# Altium footprint library NDLib.PCBLIB: 499 footprints (part 17 of 32)
Each footprint in its own frame and in the unit in brackets; x right, y up, seen from the top. Pads: shape width x height; smd on the part's side, far side on the other; paste and mask are expansions set on the pad; w line width, h text height; cw(c..) or ccw(c..) is an arc to the next point about the centre after c.
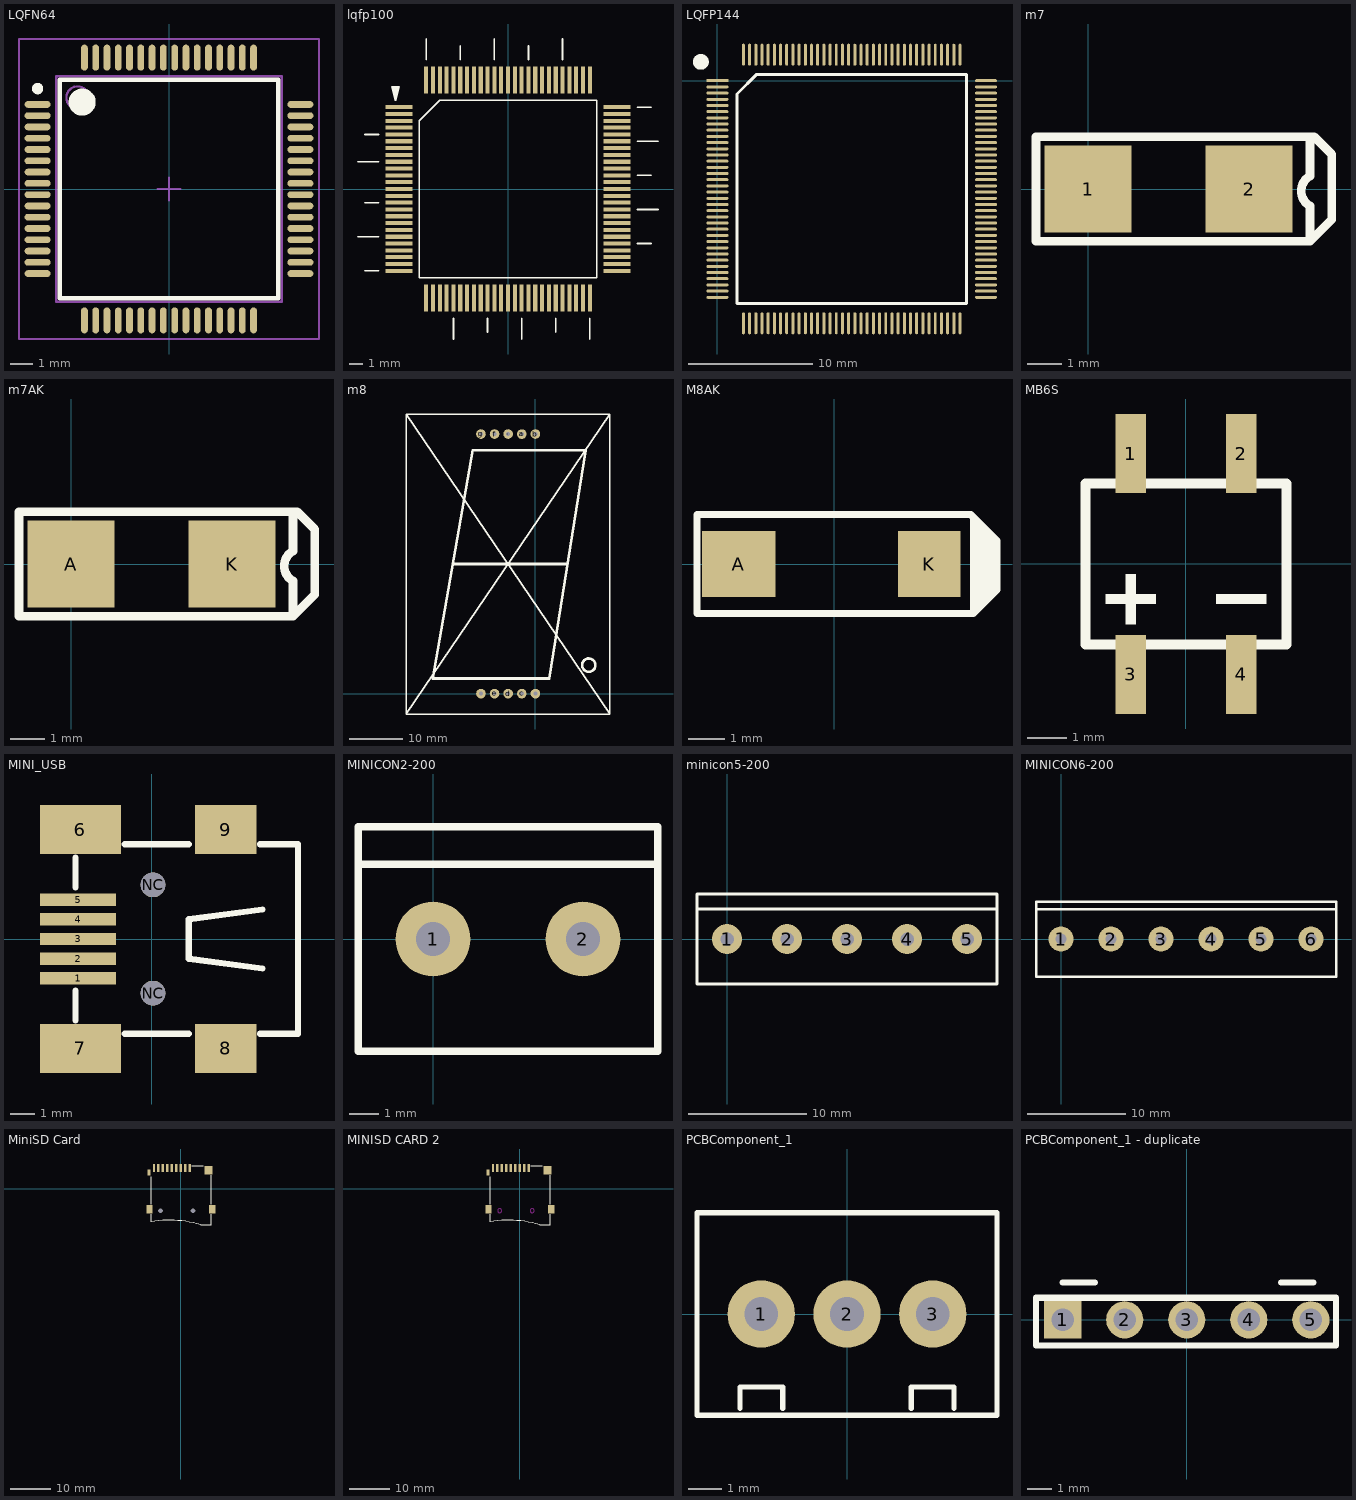
[diagram p16: the footprints below, top view; thin cyan lines are the x and y axes]

## LQFN64 [mm] "TSQFP, 64-Leads, Body 12.0x12.0mm (max), Pitch 0.50mm, IPC Medium Density"
height 1.5
pads (64):
  oval 1.15x0.3 smd: 1(-5.825,3.75) 2(-5.825,3.25) 3(-5.825,2.75) 4(-5.825,2.25) 5(-5.825,1.75) 6(-5.825,1.25) 7(-5.825,0.75) 8(-5.825,0.25) 9(-5.825,-0.25) 10(-5.825,-0.75) 11(-5.825,-1.25) 12(-5.825,-1.75) 13(-5.825,-2.25) 14(-5.825,-2.75) 15(-5.825,-3.25) 16(-5.825,-3.75) 33(5.825,-3.75) 34(5.825,-3.25) 35(5.825,-2.75) 36(5.825,-2.25) 37(5.825,-1.75) 38(5.825,-1.25) 39(5.825,-0.75) 40(5.825,-0.25) 41(5.825,0.25) 42(5.825,0.75) 43(5.825,1.25) 44(5.825,1.75) 45(5.825,2.25) 46(5.825,2.75) 47(5.825,3.25) 48(5.825,3.75)
  oval 0.3x1.15 smd: 17(-3.75,-5.825) 18(-3.25,-5.825) 19(-2.75,-5.825) 20(-2.25,-5.825) 21(-1.75,-5.825) 22(-1.25,-5.825) 23(-0.75,-5.825) 24(-0.25,-5.825) 25(0.25,-5.825) 26(0.75,-5.825) 27(1.25,-5.825) 28(1.75,-5.825) 29(2.25,-5.825) 30(2.75,-5.825) 31(3.25,-5.825) 32(3.75,-5.825) 49(3.75,5.825) 50(3.25,5.825) 51(2.75,5.825) 52(2.25,5.825) 53(1.75,5.825) 54(1.25,5.825) 55(0.75,5.825) 56(0.25,5.825) 57(-0.25,5.825) 58(-0.75,5.825) 59(-1.25,5.825) 60(-1.75,5.825) 61(-2.25,5.825) 62(-2.75,5.825) 63(-3.25,5.825) 64(-3.75,5.825)
TopOverlay:
  circle w0.25: c-5.825,4.45 r0.125
  circle w0.6: c-3.85,3.85 r0.3
  lines w0.2: -4.85,-4.85 -4.85,4.85 4.85,4.85 4.85,-4.85 -4.85,-4.85
Mechanical13:
  circle w0.1: c-4.05,4.05 r0.5
  lines w0.1: -5,-5 -5,5 5,5 5,-5 -5,-5
Mechanical15:
  lines w0.1: -0.5,0 0.5,0 ; 0,-0.5 0,0.5 ; -6.65,-6.65 -6.65,6.65 6.65,6.65 6.65,-6.65 -6.65,-6.65
3D body: height 1.5, standoff 0.1, extent -5,-5 5,5

## lqfp100 [mm]
pads (100):
  rect 2x0.3 smd: 1(-8,6) 2(-8,5.5) 3(-8,5) 4(-8,4.5) 5(-8,4) 6(-8,3.5) 7(-8,3) 8(-8,2.5) 9(-8,2) 10(-8,1.5) 11(-8,1) 12(-8,0.5) 13(-8,0) 14(-8,-0.5) 15(-8,-1) 16(-8,-1.5) 17(-8,-2) 18(-8,-2.5) 19(-8,-3) 20(-8,-3.5) 21(-8,-4) 22(-8,-4.5) 23(-8,-5) 24(-8,-5.5) 25(-8,-6) 51(8,-6) 52(8,-5.5) 53(8,-5) 54(8,-4.5) 55(8,-4) 56(8,-3.5) 57(8,-3) 58(8,-2.5) 59(8,-2) 60(8,-1.5) 61(8,-1) 62(8,-0.5) 63(8,0) 64(8,0.5) 65(8,1) 66(8,1.5) 67(8,2) 68(8,2.5) 69(8,3) 70(8,3.5) 71(8,4) 72(8,4.5) 73(8,5) 74(8,5.5) 75(8,6)
  rect 0.3x2 smd: 26(-6,-8) 27(-5.5,-8) 28(-5,-8) 29(-4.5,-8) 30(-4,-8) 31(-3.5,-8) 32(-3,-8) 33(-2.5,-8) 34(-2,-8) 35(-1.5,-8) 36(-1,-8) 37(-0.5,-8) 38(0,-8) 39(0.5,-8) 40(1,-8) 41(1.5,-8) 42(2,-8) 43(2.5,-8) 44(3,-8) 45(3.5,-8) 46(4,-8) 47(4.5,-8) 48(5,-8) 49(5.5,-8) 50(6,-8) 76(6,8) 77(5.5,8) 78(5,8) 79(4.5,8) 80(4,8) 81(3.5,8) 82(3,8) 83(2.5,8) 84(2,8) 85(1.5,8) 86(1,8) 87(0.5,8) 88(0,8) 89(-0.5,8) 90(-1,8) 91(-1.5,8) 92(-2,8) 93(-2.5,8) 94(-3,8) 95(-3.5,8) 96(-4,8) 97(-4.5,8) 98(-5,8) 99(-5.5,8) 100(-6,8)
TopOverlay:
  region: -8.5,7.5 -8.25,6.5 -8,7.5
  lines w0.127: -11,-3.5 -9.5,-3.5 ; -11,2 -9.5,2 ; -10.5,-6 -9.5,-6 ; -10.5,-1 -9.5,-1 ; -10.5,4 -9.5,4 ; -6,9.5 -6,11 ; -4,-11 -4,-9.5 ; -3.5,9.5 -3.5,10.5 ; -1.5,-10.5 -1.5,-9.5 ; -1,9.5 -1,11 ; 1,-11 1,-9.5 ; 1.5,9.5 1.5,10.5 ; 3.5,-10.5 3.5,-9.5 ; 4,9.5 4,11 ; 6,-11 6,-9.5 ; 9.5,-4 10.5,-4 ; 9.5,-1.5 11,-1.5 ; 9.5,1 10.5,1 ; 9.5,3.5 11,3.5 ; 9.5,6 10.5,6 ; -8.5,7.5 -8,7.5 -8.25,6.5 -8.5,7.5 ; -6.5,-6.5 6.5,-6.5 6.5,6.5 -5,6.5 -6.5,5 -6.5,-6.5
3D body: height 1.61, standoff -0.01, extent -8.001,-7.999 7.999,8.001

## LQFP144 [mil]
height 100
pads (144):
  rect 70x9.5 smd: 1(0,0)
  oval 70x9.5 smd: 2(0,-19.68) 3(0,-39.37) 4(0,-59.05) 5(0,-78.74) 6(0,-98.42) 7(0,-118.11) 8(0,-137.79) 9(0,-157.48) 10(0,-177.16) 11(0,-196.85) 12(0,-216.53) 13(0,-236.22) 14(0,-255.91) 15(0,-275.59) 16(0,-295.27) 17(0,-314.96) 18(0,-334.64) 19(0,-354.33) 20(0,-374.01) 21(0,-393.7) 22(0,-413.38) 23(0,-433.07) 24(0,-452.75) 25(0,-472.44) 26(0,-492.12) 27(0,-511.81) 28(0,-531.5) 29(0,-551.18) 30(0,-570.87) 31(0,-590.55) 32(0,-610.24) 33(0,-629.92) 34(0,-649.61) 35(0,-669.29) 36(0,-688.98) 73(854.33,-688.98) 74(854.33,-669.29) 75(854.33,-649.61) 76(854.33,-629.92) 77(854.33,-610.24) 78(854.33,-590.55) 79(854.33,-570.87) 80(854.33,-551.18) 81(854.33,-531.5) 82(854.33,-511.81) 83(854.33,-492.12) 84(854.33,-472.44) 85(854.33,-452.75) 86(854.33,-433.07) 87(854.33,-413.38) 88(854.33,-393.7) 89(854.33,-374.01) 90(854.33,-354.33) 91(854.33,-334.64) 92(854.33,-314.96) 93(854.33,-295.27) 94(854.33,-275.59) 95(854.33,-255.91) 96(854.33,-236.22) 97(854.33,-216.53) 98(854.33,-196.85) 99(854.33,-177.16) 100(854.33,-157.48) 101(854.33,-137.79) 102(854.33,-118.11) 103(854.33,-98.42) 104(854.33,-78.74) 105(854.33,-59.05) 106(854.33,-39.37) 107(854.33,-19.68) 108(854.33,0)
  oval 9.5x70 smd: 37(82.68,-771.65) 38(102.36,-771.65) 39(122.05,-771.65) 40(141.73,-771.65) 41(161.42,-771.65) 42(181.1,-771.65) 43(200.79,-771.65) 44(220.47,-771.65) 45(240.16,-771.65) 46(259.84,-771.65) 47(279.53,-771.65) 48(299.21,-771.65) 49(318.9,-771.65) 50(338.58,-771.65) 51(358.27,-771.65) 52(377.95,-771.65) 53(397.64,-771.65) 54(417.32,-771.65) 55(437.01,-771.65) 56(456.69,-771.65) 57(476.38,-771.65) 58(496.06,-771.65) 59(515.75,-771.65) 60(535.43,-771.65) 61(555.12,-771.65) 62(574.8,-771.65) 63(594.49,-771.65) 64(614.17,-771.65) 65(633.86,-771.65) 66(653.54,-771.65) 67(673.23,-771.65) 68(692.91,-771.65) 69(712.6,-771.65) 70(732.28,-771.65) 71(751.97,-771.65) 72(771.65,-771.65) 109(771.65,82.68) 110(751.97,82.68) 111(732.28,82.68) 112(712.6,82.68) 113(692.91,82.68) 114(673.23,82.68) 115(653.54,82.68) 116(633.86,82.68) 117(614.17,82.68) 118(594.49,82.68) 119(574.8,82.68) 120(555.12,82.68) 121(535.43,82.68) 122(515.75,82.68) 123(496.06,82.68) 124(476.38,82.68) 125(456.69,82.68) 126(437.01,82.68) 127(417.32,82.68) 128(397.64,82.68) 129(377.95,82.68) 130(358.27,82.68) 131(338.58,82.68) 132(318.9,82.68) 133(299.21,82.68) 134(279.53,82.68) 135(259.84,82.68) 136(240.16,82.68) 137(220.47,82.68) 138(200.79,82.68) 139(181.1,82.68) 140(161.42,82.68) 141(141.73,82.68) 142(122.05,82.68) 143(102.36,82.68) 144(82.68,82.68)
TopOverlay:
  circle w25: c-52.5,60 r12.5
  lines w10: 62.4,-709.25 62.4,-42.13 124.8,20.28 791.93,20.28 791.93,-709.25 62.4,-709.25

## m7 [mil]
pads (2):
  rect 100x100 smd: 1(0,0) 2(185,0)
TopOverlay:
  lines w10: 255,-20 255,-60 ; 255,-19.64 cw(c265,-2.32) 255,15 ; 255,14.64 255,60 ; 255,-60 -60,-60 -60,60 255,60 ; 255,-60 280,-35 280,40 260,60 255,60

## m7AK [mil]
pads (2):
  rect 100x100 smd: A(0,0) K(185,0)
TopOverlay:
  lines w10: 255,-20 255,-60 ; 255,-19.64 cw(c265,-2.32) 255,15 ; 255,14.64 255,60 ; 255,-60 280,-35 280,40 260,60 255,60 ; 255,-60 -60,-60 -60,60 255,60

## m8 [mm]
pads (10):
  round 1.8 hole 0.762: .(-5.089,48.464) a(-2.549,48.454) b(-0.009,48.464) c(-2.549,-0.006) d(-5.089,0.004) e(-7.629,0.004) f(-7.629,48.464) g(-10.169,48.464) greed+(-0.009,0.004) red+(-10.169,0.004)
TopOverlay:
  lines w0.254: -24.099,52.204 -24.099,-3.796 ; -24.099,-3.796 13.861,-3.796 ; -24.099,-3.796 -24.099,-3.766 ; -24.099,-3.796 -24.099,-3.766 ; -24.099,-3.766 13.861,52.174 ; 13.861,-3.796 13.861,52.174 ; 13.861,-3.796 13.861,-3.706 -24.069,52.174 13.861,52.174
  lines w0.5: -15.309,24.214 5.681,24.214 ; 11.133,5.717 ccw(c9.955,5.322) 11.167,5.592 ; -19.139,2.844 2.591,2.844 9.391,45.454 -11.729,45.454 -19.139,2.844

## M8AK [mm]
pads (2):
  rect 2x1.8 smd: A(-2.6,0)
  rect 1.7x1.8 smd: K(2.6,0)
TopOverlay:
  lines w0.2: -3.736,1.356 -3.736,-1.344 2.968,-1.344 ; -3.032,1.356 2.868,1.356 ; 3.81,-1.33 3.81,1.27
  lines w0.203: -3.736,1.356 -3.032,1.356 ; 2.868,1.356 3.724,1.356 3.81,1.27 4.445,0.635 4.445,-0.695 3.81,-1.33 3.796,-1.344 2.968,-1.344 ; 3.949,-1.037 3.949,0.994 ; 4.099,-0.991 4.108,0.844 ; 4.282,0.788 4.305,-0.775

## MB6S [mil]
height 118
pads (4):
  rect 30x78.74 smd: 1(-55,110) 2(55,110) 3(-55,-110) 4(55,-110)
TopOverlay:
  rectangle: -80,-40 -30,-30
  rectangle: -60,-60 -50,-10
  rectangle: 30,-40 80,-30
  lines w10: -100,-80 100,-80 100,80 -100,80 -100,-80

## MINI_USB [mm]
pads (11):
  rect 3.1x0.5 smd: 1(-3,-1.6) 2(-3,-0.8) 3(-3,0) 4(-3,0.8) 5(-3,1.6)
  rect 3.3x2 smd: 6(-2.9,4.45) 7(-2.9,-4.45)
  rect 2.5x2 smd: 8(3,-4.45) 9(3,4.45)
  round 1 hole 1: NC(0.05,-2.2) NC(0.05,2.2)
TopOverlay:
  lines w0.254: -3.1,-3.3 -3.1,-2.1 ; -3.1,2.1 -3.1,3.3 ; -1.1,-3.85 1.5,-3.85 ; -1.1,3.85 1.5,3.85 ; 4.4,-3.85 5.95,-3.85 5.95,3.85 4.4,3.85 ; 4.5,-1.2 1.5,-0.8 1.5,0.8 4.5,1.2

## MINICON2-200 [mil]
pads (2):
  round 100 hole 45: 1(0,0) 2(200,0)
TopOverlay:
  lines w10: -100,100 300,100 ; -100,-150 300,-150 300,150 -100,150 -100,-150

## minicon5-200 [mil]
pads (5):
  round 100 hole 45: 1(0,0) 2(200,0) 3(400,0) 4(600,0) 5(800,0)
TopOverlay:
  lines w10: -100,100 900,100 ; -100,-150 700,-150 900,-150 900,150 -100,150 -100,-150

## MINICON6-200 [mil]
pads (6):
  round 100 hole 45: 1(0,0) 2(200,0) 3(400,0) 4(600,0) 5(800,0) 6(1000,0)
TopOverlay:
  lines w10: -100,120 1100,120 ; -100,-150 -100,150 1100,150 1100,-150 700,-150 -100,-150

## MiniSD Card [mm]
pads (15):
  rect 0.6x2 smd: 1(2.23,5.075) 2(1.13,5.075) 3(0.03,5.075) 4(-1.07,5.075) 5(-2.17,5.075) 6(-3.27,5.075) 7(-4.37,5.075) 8(-5.47,5.075) 9(-6.57,5.075)
  rect 0.8x1.5 smd: 10(-7.779,3.942)
  rect 2x2 smd: 11(6.88,4.534)
  rect 1.5x2 smd: 12(-7.652,-5.075) 13(7.78,-5.066)
  round 0.5 hole 1.2: 14(-4.921,-5.425) 14(3.08,-5.425)
TopOverlay:
  lines w0.254: -7.271,-3.805 -7.271,2.926 ; 2.762,5.593 5.556,5.593 ; 7.533,-6.273 7.533,-8.831 4.935,-8.831 ccw(c-2.868,-37.81) -7.271,-8.123 -7.271,-6.345 ; 7.533,-3.86 7.533,3.252 ; -7.271,-6.345 -7.271,-6.345

## MINISD CARD 2 [mm]
pads (13):
  rect 0.6x2 smd: 1(2.23,5.075) 2(1.13,5.075) 3(0.03,5.075) 4(-1.07,5.075) 5(-2.17,5.075) 6(-3.27,5.075) 7(-4.37,5.075) 8(-5.47,5.075) 9(-6.57,5.075)
  rect 0.8x1.5 smd: 10(-7.779,3.942)
  rect 2x2 smd: 11(6.88,4.534)
  rect 1.5x2 smd: 12(-7.652,-5.075) 13(7.78,-5.066)
TopOverlay:
  lines w0.254: -7.271,-3.805 -7.271,2.926 ; 2.762,5.593 5.556,5.593 ; 7.533,-6.273 7.533,-8.831 4.935,-8.831 ccw(c-2.868,-37.81) -7.271,-8.123 -7.271,-6.345 ; 7.533,-3.86 7.533,3.252 ; -7.271,-6.345 -7.271,-6.345
KeepOutLayer:
  lines w0.254: -5.42,-5.425 cw(c-4.92,-5.425) -4.42,-5.425 cw(c-4.92,-5.425) -5.42,-5.425 ; 2.58,-5.425 cw(c3.08,-5.425) 3.58,-5.425 cw(c3.08,-5.425) 2.58,-5.425
DrillDrawing:
  circle w0.254: c-4.92,-5.425 r0.5
  circle w0.254: c3.08,-5.425 r0.5

## PCBComponent_1 [mm]
pads (3):
  round 2 hole 1: 1(-2.54,0) 2(0,0) 3(2.54,0)
TopOverlay:
  lines w0.152: -3.175,-2.794 -3.175,-2.159 -1.905,-2.159 -1.905,-2.794 ; 1.905,-2.794 1.905,-2.159 3.175,-2.159 3.175,-2.794 ; -4.445,-3 4.445,-3 4.445,3 -4.445,3 -4.445,-3

## PCBComponent_1 - duplicate [mm]
pads (5):
  rect 1.5x1.5 hole 0.9: 1(-5,0)
  round 1.5 hole 0.9: 2(-2.5,0) 3(0,0) 4(2.5,0) 5(5,0)
TopOverlay:
  lines w0.254: -5,1.5 -3.7,1.5 ; 3.8,1.5 5.1,1.5 ; -6.075,-1.032 6.015,-1.032 6.015,0.894 -6.075,0.894 -6.075,-1.032